# Altium footprint library PcbLib.PcbLib: 428 footprints (part 23 of 27)
Each footprint in its own frame and in the unit in brackets; x right, y up, seen from the top. Pads: shape width x height; smd on the part's side, far side on the other; paste and mask are expansions set on the pad; w line width, h text height; cw(c..) or ccw(c..) is an arc to the next point about the centre after c.
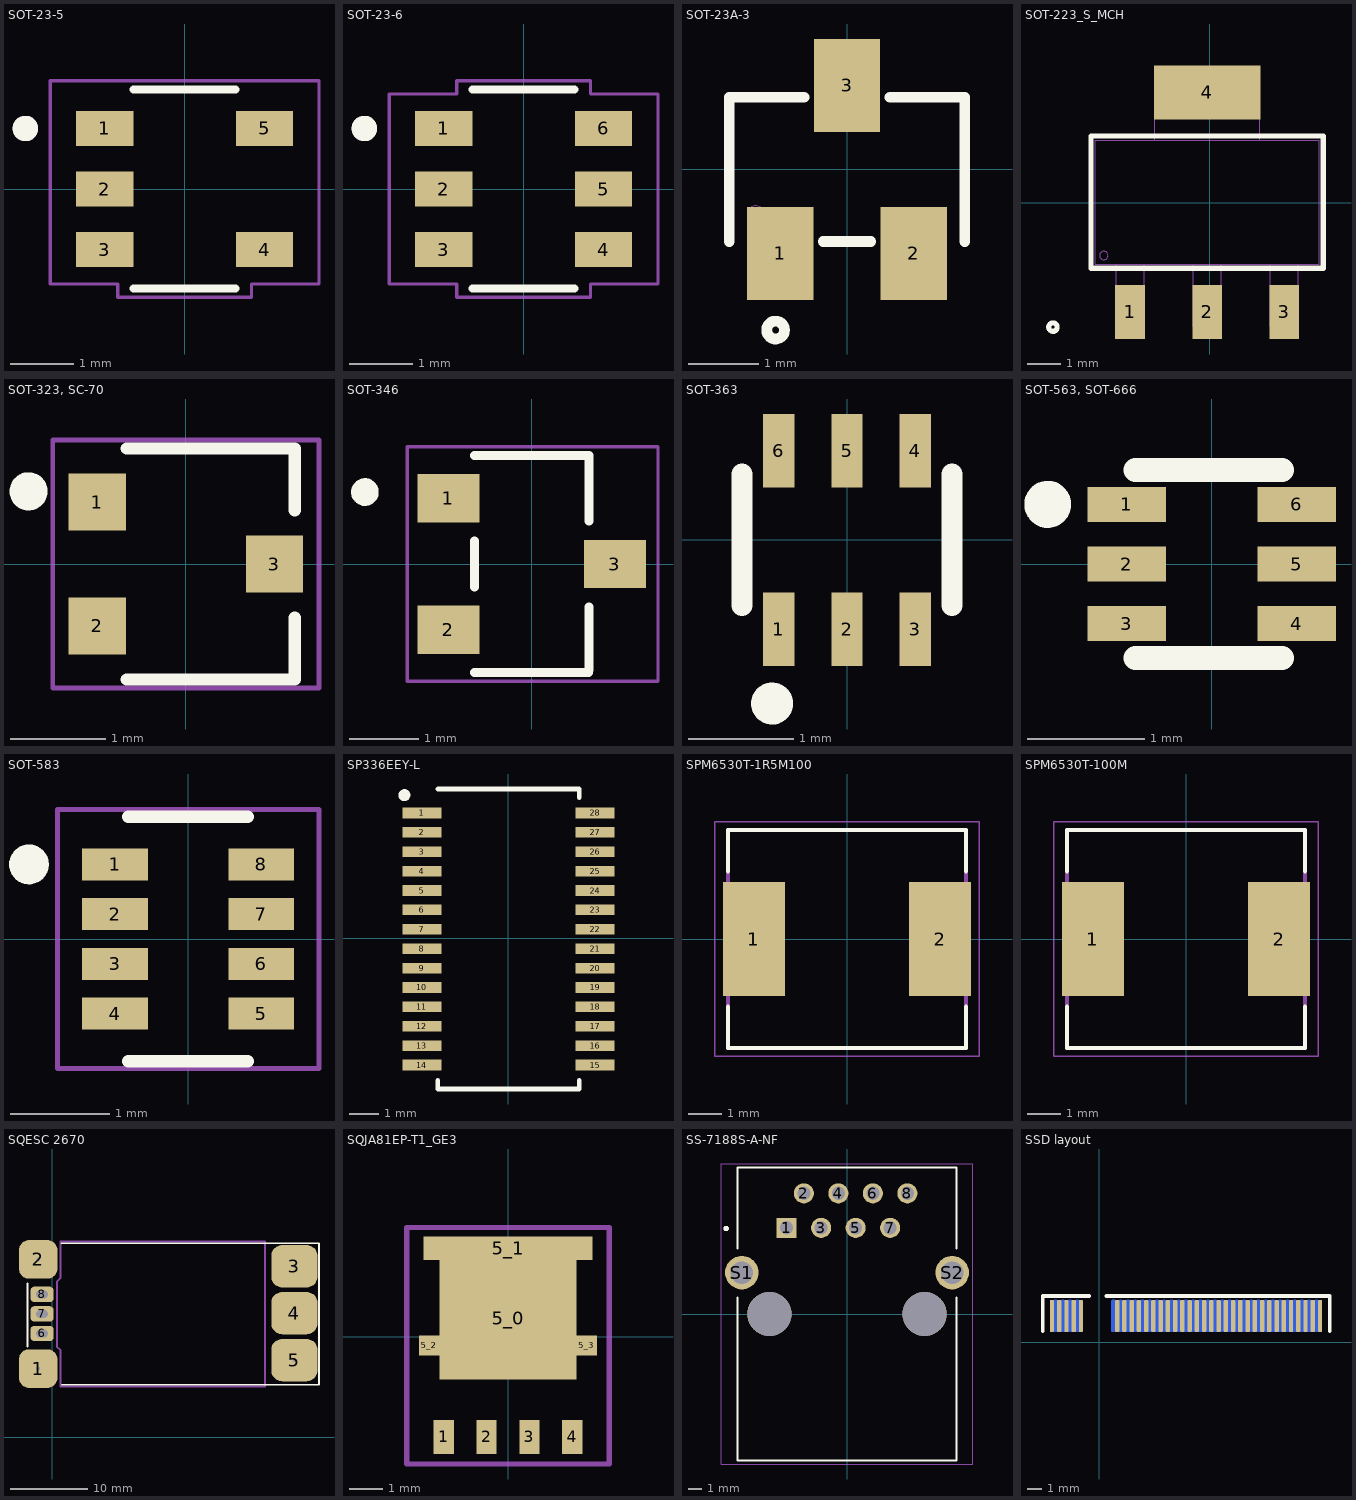
[diagram p22: the footprints below, top view; thin cyan lines are the x and y axes]

## SOT-23-5 [mm]
pads (5):
  rect 0.9x0.55 smd: 1(-1.255,0.95) 2(-1.255,0) 3(-1.255,-0.95) 4(1.255,-0.95) 5(1.255,0.95)
Top Overlay:
  circle w0.2: c-2.5,0.95 r0.1
  lines w0.127: -0.8,-1.56 0.8,-1.56 ; -0.8,1.56 0.8,1.56
Mechanical 13:
  circle w0.2: c-2.5,0.95 r0.1
Mechanical 15:
  lines w0.05: -2.11,-1.49 -1.05,-1.49 -1.05,-1.7 1.05,-1.7 1.05,-1.49 2.11,-1.49 2.11,1.7 1.05,1.7 -1.05,1.7 -2.11,1.7 -2.11,-1.49
3D body "LP2985-33DBVR.STEP": height 1.45, standoff 0, extent -1.4,-1.45 1.4,1.45

## SOT-23-6 [mm]
pads (6):
  rect 0.9x0.55 smd: 1(-1.255,0.95) 2(-1.255,0) 3(-1.255,-0.95) 4(1.255,-0.95) 5(1.255,0) 6(1.255,0.95)
Top Overlay:
  circle w0.2: c-2.5,0.95 r0.1
  lines w0.127: -0.8,-1.56 0.8,-1.56 ; -0.8,1.56 0.8,1.56
Mechanical 13:
  circle w0.2: c-2.5,0.95 r0.1
Mechanical 15:
  lines w0.05: -2.11,-1.49 -1.05,-1.49 -1.05,-1.7 1.05,-1.7 1.05,-1.49 2.11,-1.49 2.11,1.49 1.05,1.49 1.05,1.7 -1.05,1.7 -1.05,1.49 -2.11,1.49 -2.11,-1.49
3D body "step_temp.STEP": height 1.45, standoff 0, extent -1.4,-1.45 1.4,1.45

## SOT-23A-3 [mil]
pads (3):
  rect 37x52 smd paste+0 mask+0: 1(-37.4,-47.06) 2(37.4,-47.06) 3(0,47.06)
Top Overlay:
  circle w6: c-40,-90 r5
  lines w6: -66.02,-40.43 -66.02,40.43 -24.1,40.43 ; -13.3,-40.43 13.3,-40.43 ; 24.1,40.43 66.02,40.43 66.02,-40.43
Mechanical 13:
  circle w0: c-51.02,-25.43 r5
3D body "SOT-23A_MC_MCH.step": height 57.09, standoff 0, extent -61.02,-59.06 61.02,59.06

## SOT-223_S_MCH [mil]
pads (4):
  rect 35x64 smd paste+0 mask+0: 1(-94,-128.5) 2(-3,-128.5) 3(88,-128.5)
  rect 126x64 smd paste+0 mask+0: 4(-3,130.5)
Top Overlay:
  circle w6: c-185,-146.5 r5
  lines w6: -140,-77 134,-77 134,79 -140,79 -140,-77
Mechanical 13:
  circle w0: c-125,-62 r5
  lines w1: -135,-72 129,-72 129,74 -135,74 -135,-72 ; -110.5,-146.5 -110.5,-72 -77.5,-72 -77.5,-146.5 -110.5,-146.5 ; -65,74 59,74 59,148.5 -65,148.5 -65,74 ; -19.5,-146.5 -19.5,-72 13.5,-72 13.5,-146.5 -19.5,-146.5 ; 71.5,-146.5 71.5,-72 104.5,-72 104.5,-146.5 71.5,-146.5
3D body "SOT-223_S_MCH.step": height 71.1, standoff 0, extent -135.01,-146.52 129.01,148.52

## SOT-323, SC-70 [mm]
pads (3):
  rect 0.6x0.6 smd: 1(-0.93,0.65) 2(-0.93,-0.65) 3(0.93,0)
Top Overlay:
  circle w0.2: c-1.651,0.762 r0.1
  lines w0.127: -0.62,-1.214 1.143,-1.214 1.143,-0.564 ; -0.62,1.214 1.143,1.214 1.143,0.564
Mechanical 15:
  lines w0.05: -1.397,-1.3 1.397,-1.3 1.397,1.3 -1.397,1.3 -1.397,-1.3
3D body "step_temp.STEP": height 1.04, standoff 0.04, extent -1.05,-1.05 1.05,1.05

## SOT-346 [mm]
pads (3):
  rect 0.9x0.7 smd: 1(-1.205,0.95) 2(-1.205,-0.95) 3(1.205,0)
Top Overlay:
  circle w0.2: c-2.413,1.041 r0.1
  lines w0.127: -0.825,-1.57 0.825,-1.57 ; -0.825,-0.336 -0.825,0.336 ; -0.825,1.57 0.83,1.57 0.83,0.62 ; 0.83,-1.536 0.83,-0.62
Mechanical 15:
  lines w0.05: -1.803,-1.7 1.829,-1.7 1.829,1.7 -1.803,1.7 -1.803,-1.7
3D body "DTC123JKAT146.STEP": height 1.3, standoff 0, extent -1.375,-1.45 1.425,1.45

## SOT-363 [mm]
pads (6):
  rect 0.3x0.7 smd: 1(-0.65,-0.85) 2(0,-0.85) 3(0.65,-0.85) 4(0.65,0.85) 5(0,0.85) 6(-0.65,0.85)
Top Overlay:
  circle w0.2: c-0.713,-1.559 r0.1
  lines w0.203: -1,-0.625 -1,0.625 ; 1,-0.625 1,0.625
3D body "74LVC2G17GW,125.STEP": height 1.1, standoff 0, extent -1,-1.016 1,1.084

## SOT-563, SOT-666 [mm]
pads (6):
  rect 0.67x0.3 smd: 1(-0.724,0.508) 2(-0.724,0) 3(-0.724,-0.508) 4(0.724,-0.508) 5(0.724,0) 6(0.724,0.508)
Top Overlay:
  circle w0.2: c-1.397,0.508 r0.1
  lines w0.203: -0.65,-0.8 0.6,-0.8 ; -0.65,0.8 0.6,0.8
3D body "MMDT3906V-7.STEP": height 0.6, standoff 0, extent -0.8,-0.8 0.8,0.8

## SOT-583 [mm]
height 0.6
pads (8):
  rect 0.66x0.32 smd: 1(-0.735,0.75) 2(-0.735,0.25) 3(-0.735,-0.25) 4(-0.735,-0.75) 5(0.735,-0.75) 6(0.735,-0.25) 7(0.735,0.25) 8(0.735,0.75)
Top Overlay:
  circle w0.2: c-1.6,0.75 r0.1
  lines w0.127: -0.6,-1.23 0.6,-1.23 ; -0.6,1.23 0.6,1.23
Mechanical 15:
  lines w0.05: -1.315,-1.3 -1.315,1.3 1.315,1.3 1.315,-1.3 -1.315,-1.3
3D body "step_temp.STEP": height 0.6, standoff 0, extent -0.8,-1.05 0.8,1.05

## SP336EEY-L [mil] "Programmable 3.3/5V RS-232 / RS-485/RS-422 Serial Transceiver"
pads (28):
  rect 51.5x14 smd paste+0 mask+0: 1(-113.78,165.43) 2(-113.78,139.84) 3(-113.78,114.25) 4(-113.78,88.66) 5(-113.78,63.07) 6(-113.78,37.48) 7(-113.78,11.89) 8(-113.78,-13.7) 9(-113.78,-39.29) 10(-113.78,-64.88) 11(-113.78,-90.47) 12(-113.78,-116.06) 13(-113.78,-141.65) 14(-113.78,-167.24) 15(114.72,-167.24) 16(114.72,-141.65) 17(114.72,-116.06) 18(114.72,-90.47) 19(114.72,-64.88) 20(114.72,-39.29) 21(114.72,-13.7) 22(114.72,11.89) 23(114.72,37.48) 24(114.72,63.07) 25(114.72,88.66) 26(114.72,114.25) 27(114.72,139.84) 28(114.72,165.43)
Top Overlay:
  circle w7.87: c-137,189 r3.94
  lines w6: -93.03,-187.34 -93.03,-198.91 93.97,-198.91 93.97,-187.34 ; -93.03,197.09 93.97,197.09 93.97,185.53
3D body "TSSOP-28.step": height 47.09, standoff 0, extent -125.51,-193.9 126.46,192.09

## SPM6530T-1R5M100 [mm]
height 3
pads (2):
  rect 1.85x3.4 smd: 1(-2.775,0) 2(2.775,0)
Top Overlay:
  lines w0.127: -3.55,-2.02 -3.55,-3.25 3.55,-3.25 3.55,-2.02 ; -3.55,2.02 -3.55,3.25 3.55,3.25 3.55,2.02
Mechanical 13:
  lines w0.127: -3.55,-3.25 -3.55,3.25 3.55,3.25 3.55,-3.25 -3.55,-3.25
Mechanical 15:
  lines w0.05: -3.95,-3.5 -3.95,3.5 3.95,3.5 3.95,-3.5 -3.95,-3.5
3D body "step_temp.STEP": height 3, standoff 0, extent -3.55,-3.25 3.55,3.25

## SPM6530T-100M [mm]
height 3
pads (2):
  rect 1.85x3.4 smd: 1(-2.775,0) 2(2.775,0)
Top Overlay:
  lines w0.127: -3.55,-2.02 -3.55,-3.25 3.55,-3.25 3.55,-2.02 ; -3.55,2.02 -3.55,3.25 3.55,3.25 3.55,2.02
Mechanical 13:
  lines w0.127: -3.55,-3.25 3.55,-3.25 3.55,3.25 -3.55,3.25 -3.55,-3.25
Mechanical 15:
  lines w0.05: -3.95,-3.5 3.95,-3.5 3.95,3.5 -3.95,3.5 -3.95,-3.5
3D body "step_temp.STEP": height 3, standoff 0, extent -3.55,-3.25 3.55,3.25

## SQESC 2670 [mm]
pads (8):
  rrect50% 5x5 hole 0.5 paste+0 mask+0.102: 1(-1.8,8.9) 2(-1.8,23.1)
  rrect50% 6x5.5 hole 0.5 paste+0 mask+0.102: 3(31.5,22.2) 4(31.5,16.11) 5(31.5,10)
  rrect50% 3x2 hole 1 slot 1.5 at 0 deg paste+0 mask+0.102: 6(-1.308,13.468) 7(-1.308,16.008) 8(-1.308,18.548)
Top Overlay:
  lines w0.254: -3.2,11.8 -3.2,20 ; 1.2,25.2 34.7,25.2 34.7,6.8 1.3,6.8
Mechanical 1:
  lines w0.254: 0.617,11.767 1.1,11.284 1.1,6.579 27.694,6.579 27.694,25.4 1.1,25.4 1.1,20.695 0.617,20.212 0.617,11.767
3D body "SQESC 2670-3d-24-12-13.STEP": height 4, standoff -1.6, extent -3.001,6.98 31.999,24.98

## SQJA81EP-T1_GE3 [mm]
pads (8):
  rect 0.6x1 smd paste+0.027 mask+0.05: 1(-1.905,-2.97) 2(-0.635,-2.97) 3(0.635,-2.97) 4(1.905,-2.97)
  rect 4.061x3.63 smd paste-2539.97: 5_0(0,0.545)
  rect 5x0.7 smd paste+0.03: 5_1(0,2.615)
  rect 0.61x0.595 smd: 5_2(-2.328,-0.255) 5_3(2.328,-0.255)
Top Paste:
  rectangle: -1.77,0.52 -0.17,2.02
  rectangle: 0.15,0.51 1.75,2.01
  rectangle: -1.77,-1.2 -0.17,0.3
  rectangle: 0.16,-1.2 1.76,0.3
Mechanical 15:
  lines w0.152: -3,-3.77 -3,3.23 3,3.23 3,-3.77 -3,-3.77
3D body "step_temp.STEP": height 1.07, standoff 0, extent -2.56,-3.332 2.56,2.818

## SS-7188S-A-NF [mm]
pads (12):
  rect 1.478x1.478 hole 0.97: 1(-4.445,6.35)
  round 1.478 hole 0.97: 2(-3.175,8.89) 3(-1.905,6.35) 4(-0.635,8.89) 5(0.635,6.35) 6(1.905,8.89) 7(3.175,6.35) 8(4.445,8.89)
  round 2.475 hole 1.65: S1(-7.745,3.05) S2(7.745,3.05)
  round 3.25 hole 3.25 unplated: ""(-5.715,0) ""(5.715,0)
Top Overlay:
  circle w0.2: c-8.9,6.3 r0.1
  lines w0.127: -8.065,1.23 -8.065,-10.79 8.065,-10.79 8.065,1.23 ; -8.065,4.8 -8.065,10.8 8.065,10.8 8.065,4.8
Mechanical 13:
  circle w0.2: c-8.9,6.3 r0.1
Mechanical 15:
  lines w0.05: -9.25,-11.04 -9.25,11.05 9.25,11.05 9.25,-11.04 -9.25,-11.04
3D body "SS-7188S-A-NF--3DModel-STEP-56544.STEP": height 14.19, standoff -3.59, extent -8.064,-10.795 8.064,10.795

## SSD layout [mm]
height 4.2
pads (67):
  rrect50% 0.3x2.2 smd paste-2539.97: 1(15.241,1.825) 3(14.741,1.825) 5(14.241,1.825) 7(13.741,1.825) 9(13.241,1.825) 11(12.741,1.825) 13(12.241,1.825) 15(11.741,1.825) 17(11.241,1.825) 19(10.741,1.825) 21(10.241,1.825) 23(9.741,1.825) 25(9.241,1.825) 27(8.741,1.825) 29(8.241,1.825) 31(7.741,1.825) 33(7.241,1.825) 35(6.741,1.825) 37(6.241,1.825) 39(5.741,1.825) 41(5.241,1.825) 43(4.741,1.825) 45(4.241,1.825) 47(3.741,1.825) 49(3.241,1.825) 51(2.741,1.825) 53(2.241,1.825) 55(1.741,1.825) 57(1.241,1.825) 67(-1.259,1.825) 69(-1.759,1.825) 71(-2.259,1.825) 73(-2.759,1.825) 75(-3.259,1.825)
  rrect50% 0.3x2.2 smd far side paste-2539.97: 2(14.991,1.829) 4(14.491,1.829) 6(13.991,1.829) 8(13.491,1.829) 10(12.991,1.829) 12(12.491,1.829) 14(11.991,1.829) 16(11.491,1.829) 18(10.991,1.829) 20(10.491,1.829) 22(9.991,1.829) 24(9.491,1.829) 26(8.991,1.829) 28(8.491,1.829) 30(7.991,1.829) 32(7.491,1.829) 34(6.991,1.829) 36(6.491,1.829) 38(5.991,1.829) 40(5.491,1.829) 42(4.991,1.829) 44(4.491,1.829) 46(3.991,1.829) 48(3.491,1.829) 50(2.991,1.829) 52(2.491,1.829) 54(1.991,1.829) 56(1.491,1.829) 58(0.991,1.829) 68(-1.509,1.829) 70(-2.009,1.829) 72(-2.509,1.829) 74(-3.009,1.829)
Top Overlay:
  lines w0.254: -3.899,0.762 -3.899,3.2 -0.682,3.2 ; 0.498,3.2 15.908,3.2 ; 15.913,0.762 15.913,3.2